# Altium schematic symbol library IC.SchLib: 555 symbols (part 9 of 15) (continued)
## PEX8648BB (continued)
part F pins: G7 VDD25 (power), G9 VDD10A (power), G10 VDD10A (power), G11 VDD10A (power), G12 VDD10A (power), G13 VDD10A (power), G14 VDD10A (power), G15 VDD10A (power), G16 VDD10A (power), G17 VDD10A (power), G18 VDD10A (power), G20 VDD25 (power), H8 VDD25 (power), H19 VDD25 (power), J7 VDD10A (power), J9 VDD25 (power), J11 VDD10A (power), J13 VDD10A (power), J14 VDD10A (power), J16 VDD10A (power), J18 VDD25 (power), J20 VDD10A (power), K7 VDD10A (power), K10 VDD25 (power), K12 VDD25A (power), K15 VDD25A (power), K17 VDD25 (power), K20 VDD10A (power), L7 VDD10A (power), L9 VDD10A (power), L11 VDD10 (power), L13 VDD10 (power), L15 VDD10 (power), L18 VDD10A (power), L20 VDD10A (power), M7 VDD10A (power), M9 VDD10A (power), M12 VDD10 (power), M14 VDD10 (power), M16 VDD10 (power), M18 VDD10A (power), M20 VDD10A (power), N7 VDD10A (power), N10 VDD25A (power), N11 VDD10 (power), N13 VDD10 (power), N15 VDD10 (power), N17 VDD25A (power), N20 VDD10A (power), P7 VDD10A (power), P9 VDD10A (power), P12 VDD10 (power), P14 VDD10 (power), P16 VDD10 (power), P18 VDD10A (power), P20 VDD10A (power), R7 VDD10A (power), R10 VDD10A (power), R11 VDD10 (power), R13 VDD10 (power), R15 VDD10 (power), R17 VDD10A (power), R20 VDD10A (power), T7 VDD10A (power), T9 VDD10A (power), T12 VDD10 (power), T14 VDD10 (power), T16 VDD10 (power), T18 VDD10A (power), T20 VDD10A (power), U7 VDD10A (power), U10 VDD25 (power), U12 VDD25A (power), U15 VDD25A (power), U17 VDD25 (power), U20 VDD10A (power), V8 VDD25 (power), V9 VDD25 (power), V11 VDD10A (power), V13 VDD10A (power), V14 VDD10A (power), V16 VDD10A (power), V18 VDD25 (power), V19 VDD25 (power), W7 VDD25 (power), W8 VDD25 (power), W19 VDD25 (power), W20 VDD25 (power), Y7 VDD25 (power), Y9 VDD10A (power), Y10 VDD10A (power), Y11 VDD10A (power), Y12 VDD10A (power), Y13 VDD10A (power), Y14 VDD10A (power), Y15 VDD10A (power), Y16 VDD10A (power), Y17 VDD10A (power), Y18 VDD10A (power), Y20 VDD25 (power)
part A text: STATION 0 LANES
part B text: STATION 1 LANES
part C text: STATION 2 LANES
part D text: PCIe INTERFACE; JTAG INTERFACE; I2C INTERFACE; MONITORS; HOT PLUG; EEPROM INTERFACE; CONFIGURATION STRAP PINS; PORT STATUS AND GPIO; MISC. AND SPARE

## PI2DBS212
designator U?
1.8V, 1.8GHz Diff 2:1 Mux/DeMux Broadband Signal Switch; Manufacturer No: PI2DBS212ZHE; Manufacturer: Pericom; Tech: SMDR; Sort: 510; Package: TQFN28
footprint TQFN28 (TQFN 28pin 0.8mm R0.5mm)
pins: 1 GND (power), 2 NC, 3 SEL (in), 4 A0+ (io), 5 A0- (io), 6 A1+ (io), 7 A1- (io), 8 NC, 9 VDD (power), 10 GND (power), 11 VDD (power), 12 GND (power), 13 VDD (power), 14 GND (power), 15 C1- (io), 16 C1+ (io), 17 C0- (io), 18 C0+ (io), 19 VDD (power), 20 GND (power), 21 B1- (io), 22 B1+ (io), 23 B0- (io), 24 B0+ (io), 25 GND (power), 26 VDD (power), 27 GND (power), 28 VDD (power), 29 GNDE (power)

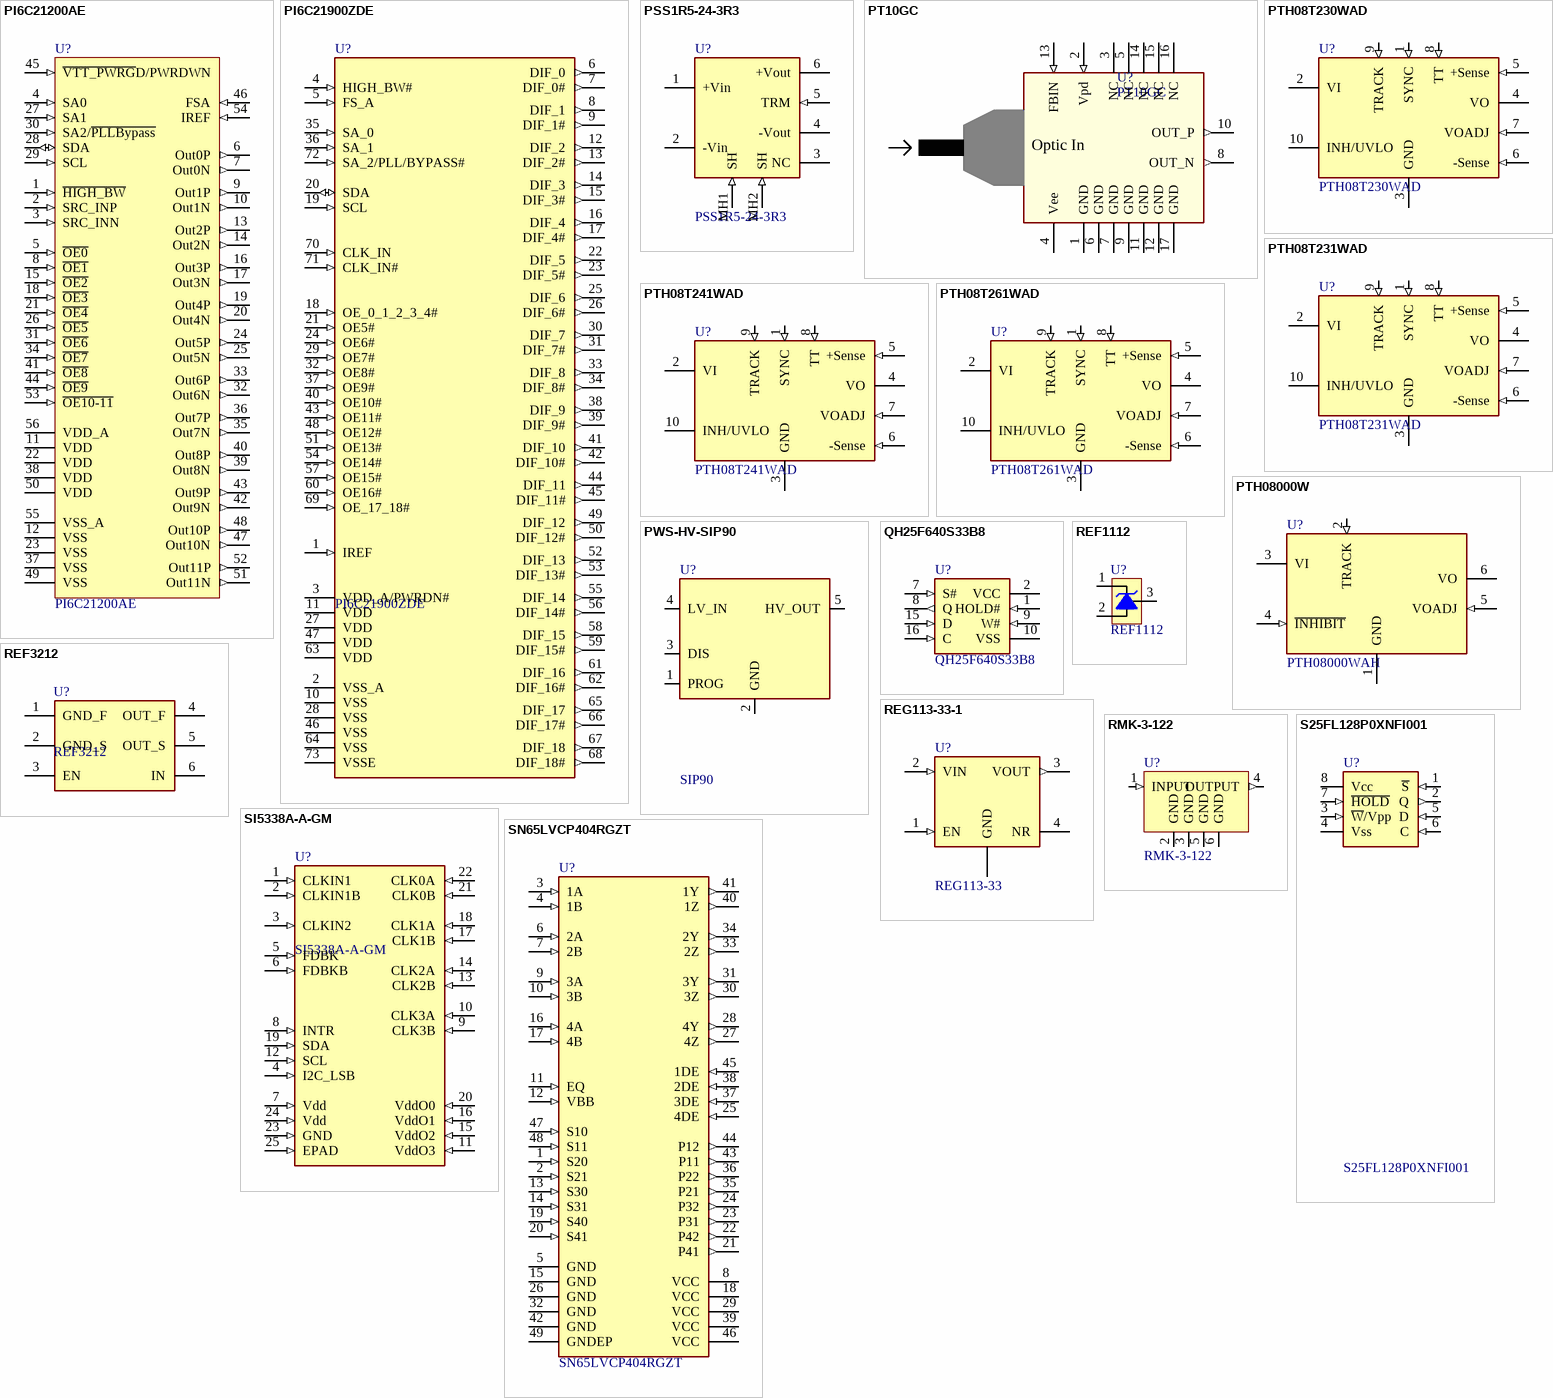
[diagram p38: symbols PI6C21200AE to SN65LVCP404RGZT]

## PI6C21200AE
designator U?
1:12 Clock Driver for Intel PCI-Express Chipsets; Manufacturer: Pericom; Tech: SMDR; Sort: 510; Manufacturer No: PI6C21200AE; Package: TSSOP56
footprint TSSOP56 (TSSOP 56pin R0.5mm)
pins: 1 ~{HIGH_BW} (in), 2 SRC_INP (in), 3 SRC_INN (in), 4 SA0 (in), 5 ~{OE0} (in), 6 Out0P (out), 7 Out0N (out), 8 ~{OE1} (in), 9 Out1P (out), 10 Out1N (out), 11 VDD (power), 12 VSS (power), 13 Out2P (out), 14 Out2N (out), 15 ~{OE2} (in), 16 Out3P (out), 17 Out3N (out), 18 ~{OE3} (in), 19 Out4P (out), 20 Out4N (out), 21 ~{OE4} (in), 22 VDD (power), 23 VSS (power), 24 Out5P (out), 25 Out5N (out), 26 ~{OE5} (in), 27 SA1 (in), 28 SDA (io), 29 SCL (in), 30 SA2/~{PLLBypass} (in), 31 ~{OE6} (in), 32 Out6N (out), 33 Out6P (out), 34 ~{OE7} (in), 35 Out7N (out), 36 Out7P (out), 37 VSS (power), 38 VDD (power), 39 Out8N (out), 40 Out8P (out), 41 ~{OE8} (in), 42 Out9N (out), 43 Out9P (out), 44 ~{OE9} (in), 45 ~{VTT_PWRG}D/PWRDWN (in), 46 FSA (in), 47 Out10N (out), 48 Out10P (out), 49 VSS (power), 50 VDD (power), 51 Out11N (out), 52 Out11P (out), 53 ~{OE10-11} (in), 54 IREF (in), 55 VSS_A (power), 56 VDD_A (power)

## PI6C21900ZDE
designator U?
PCI Express Gen II1: Geared Differential Buffer - 17 and 2 Outputs; Manufacturer: Pericom; Tech: SMDR; Sort: 510; Manufacturer No: PI6C21900ZDE; Package: TQFN-72
footprint TQFN72N
pins: 1 IREF (in), 2 VSS_A (power), 3 VDD_A/PWRDN# (power), 4 HIGH_BW# (in), 5 FS_A (in), 6 DIF_0 (out), 7 DIF_0# (out), 8 DIF_1 (out), 9 DIF_1# (out), 10 VSS (power), 11 VDD (power), 12 DIF_2 (out), 13 DIF_2# (out), 14 DIF_3 (out), 15 DIF_3# (out), 16 DIF_4 (out), 17 DIF_4# (out), 18 OE_0_1_2_3_4# (in), 19 SCL (in), 20 SDA (io), 21 OE5# (in), 22 DIF_5 (out), 23 DIF_5# (out), 24 OE6# (in), 25 DIF_6 (out), 26 DIF_6# (out), 27 VDD (power), 28 VSS (power), 29 OE7# (in), 30 DIF_7 (out), 31 DIF_7# (out), 32 OE8# (in), 33 DIF_8 (out), 34 DIF_8# (out), 35 SA_0 (in), 36 SA_1 (in), 37 OE9# (in), 38 DIF_9 (out), 39 DIF_9# (out), 40 OE10# (in), 41 DIF_10 (out), 42 DIF_10# (out), 43 OE11# (in), 44 DIF_11 (out), 45 DIF_11# (out), 46 VSS (power), 47 VDD (power), 48 OE12# (in), 49 DIF_12 (out), 50 DIF_12# (out), 51 OE13# (in), 52 DIF_13 (out), 53 DIF_13# (out), 54 OE14# (in), 55 DIF_14 (out), 56 DIF_14# (out), 57 OE15# (in), 58 DIF_15 (out), 59 DIF_15# (out), 60 OE16# (in), 61 DIF_16 (out), 62 DIF_16# (out), 63 VDD (power), 64 VSS (power), 65 DIF_17 (out), 66 DIF_17# (out), 67 DIF_18 (out), 68 DIF_18# (out), 69 OE_17_18# (in), 70 CLK_IN (in), 71 CLK_IN# (in), 72 SA_2/PLL/BYPASS# (in), 73 VSSE (power)

## PSS1R5-24-3R3
designator U?
Step down converter 1A SOIC8; Manufacturer: Densei-Lambda; Sort: 510; Tech: THDW; Manufacturer No: PSS1R5-24-3R3; Package: DCD/DC20x16; Price: 0
footprint PSS1R5 (DC-DC1.5W)
pins: 1 +Vin (power), 2 -Vin (power), 3 NC, 4 -Vout (power), 5 TRM (in), 6 +Vout (power), MH1 SH (in), MH2 SH (in)

## PT10GC
designator U?
10Gb/s Coplanar PIN Preamp Receiver; Manufacturer: Bookham; Sort: 510; Tech: SMDR; Manufacturer No: PT10GC; Price: 0
footprint PT10GC (10Gb/s PIN Preamp Receiver PT10GC)
pins: 1 GND (power), 2 Vpd (in), 3 NC (power), 4 Vee (power), 5 NC, 6 GND (power), 7 GND (power), 8 OUT_N (out), 9 GND (power), 10 OUT_P (out), 11 GND (power), 12 GND (power), 13 FBIN (in), 14 NC (power), 15 NC (power), 16 NC (power), 17 GND (power)
text: Optic In

## PTH08T230WAD
designator U?
6A, 4.5V to 14Vin, non-isolated, wide output, adjustable power module; Manufacturer: Texas Instruments; Comment2: 6A 4.5 -14Vin, 0.69-5.5Vout; Sort: 550; Tech: THDW; Manufacturer No: PTH08T230WAD; Package: POWMOD ECL; Price: 0
footprint PTH08TECL (Power Module 19x16x8.5mm  THT)
pins: 1 SYNC (in), 2 VI (power), 3 GND (power), 4 VO (power), 5 +Sense (in), 6 -Sense (in), 7 VOADJ (in), 8 TT (in), 9 TRACK (in), 10 INH/UVLO

## PTH08T231WAD
designator U?
6A, 4.5V to 14Vin, non-isolated, wide output, adjustable power module; cer cap.; Manufacturer: Texas Instruments; Comment2: 6A 4.5 -14Vin, 0.69-5.5Vout; Sort: 550; Tech: THDW; Manufacturer No: PTH08T231WAD; Package: POWMOD ECL; Price: 0
footprint PTH08TECL (Power Module 19x16x8.5mm  THT)
pins: 1 SYNC (in), 2 VI (power), 3 GND (power), 4 VO (power), 5 +Sense (in), 6 -Sense (in), 7 VOADJ (in), 8 TT (in), 9 TRACK (in), 10 INH/UVLO

## PTH08T241WAD
designator U?
10A, 4.5V to 14Vin, non-isolated, wide output, adjustable power module; cer cap.; Manufacturer: Texas Instruments; Comment2: 10A 4.5 -14Vin, 0.69-5.5Vout; Sort: 550; Tech: THDW; Manufacturer No: PTH08T241WAD; Package: POWMOD EBS; Price: 0
footprint PTH08TECL (Power Module 19x16x8.5mm  THT)
pins: 1 SYNC (in), 2 VI (power), 3 GND (power), 4 VO (power), 5 +Sense (in), 6 -Sense (in), 7 VOADJ (in), 8 TT (in), 9 TRACK (in), 10 INH/UVLO

## PTH08T261WAD
designator U?
3A, 4.5V to 14Vin, non-isolated, wide output, adjustable power module; cer cap.; Manufacturer: Texas Instruments; Comment2: 3A 4.5 -14Vin, 0.69-5.5Vout; Sort: 550; Tech: THDW; Manufacturer No: PTH08T261WAD; Package: POWMOD ECL; Price: 0
footprint PTH08TECL (Power Module 19x16x8.5mm  THT)
pins: 1 SYNC (in), 2 VI (power), 3 GND (power), 4 VO (power), 5 +Sense (in), 6 -Sense (in), 7 VOADJ (in), 8 TT (in), 9 TRACK (in), 10 INH/UVLO

## PTH08000W
designator U?, comment PTH08000WAH
2.25A, 4.5V to 14Vin, non-isolated, wide output, adjustable power module; Manufacturer: Texas Instruments; Comment2: 2.25A 4.5 -14Vin, 0.9-5.5Vout; Sort: 550; Tech: THDW; Manufacturer No: PTH08000WAH; Package: POWMOD EUS; Price: 0
footprint PTH08TEUS (Power Module EUS 19x13x8.5mm  THT)
pins: 1 GND (power), 2 TRACK (in), 3 VI (power), 4 ~{INHIBIT} (in), 5 VOADJ (in), 6 VO (power)

## PWS-HV-SIP90
designator U?, comment SIP90
Regulated, Low Ripple High Voltage DC/DC Converter; Manufacturer: Emco; Comment2: 3-6.7V Vin, 25-90 VDC, 1mA max; Sort: 510; Tech: TMDW; Manufacturer No: SIP90; Package: SIP90; Price: 0; Supplier: EMCO; Supplier No: SIP90
footprint SIP90 (SIP90 Emco HV Power supply)
pins: 1 PROG, 2 GND, 3 DIS, 4 LV_IN, 5 HV_OUT

## QH25F640S33B8
designator U?
EEPROM 64Mbit SPI 2.5-3.3V 33.3/68MHz read; Manufacturer: Intel; Sort: 510; Tech: SMDR; Manufacturer No: QH25F640S33B8; Package: SOIC16W; Price: 0
signal-integrity model Model Name (Model Description)
footprint SOIC16WN (SOIC, 16-Leads, Body 10,4x7,5mm (max), Pitch 1,27mm, IPC Medium Density)
pins: 1 HOLD# (in), 2 VCC (power), 7 S# (in), 8 Q (out), 9 W# (in), 10 VSS (power), 15 D (in), 16 C (in)

## REF1112
designator U?
Voltage reference; low noise 1.25V; Manufacturer: Texas Instruments; Comment2: 10ppm/C, 1uA, 1.25V, 5mA MAX; Sort: 510; Tech: SMDR; Package: SOT23; Manufacturer No: REF1112; Price: 0
footprint SOT23-1
pins: 1 C, 2 A, 3 REF

## REF3212
designator U?
Series Voltage Reference; Manufacturer: Texas Instruments; Manufacturer No: REF3212AIDBVT; Comment2: 1.25V, 4ppm/C, 100uA, 10mA MAX; Sort: 510; Tech: SMDR; Package: SOT23; Price: 0
footprint SOT23-6
pins: 1 GND_F, 2 GND_S, 3 EN, 4 OUT_F, 5 OUT_S, 6 IN

## REG113-33-1
designator U?, comment REG113-33
DMOS 400mA Low Drop Regulator; Manufacturer: Linear Technologies; Manufacturer No: REG113NA-3.3/250; Sort: 510; Tech: SMDR; Package: MSOP; Price: 0
footprint SOT23-5
pins: 1 EN (in), 2 VIN (in), 3 VOUT (out), 4 NR, GND (power)

## RMK-3-122
designator U?
Mixer; Manufacturer: MiniCircuits; Sort: 510; Tech: SMDR; Package: SOT89; Price: 0
footprint RMK-3
pins: 1 INPUT (in), 2 GND (power), 3 GND (power), 4 OUTPUT (out), 5 GND (power), 6 GND (power)

## S25FL128P0XNFI001
designator U?
128 Mbit serial flash memory with 104MHz SPI bus; Manufacturer: Spansion, Farnell; Manufacturer No: S25FL128P0XNFI001, 1791301; Comment2: 128Mbit, SPI, 104MHz 2,7~3,6Vcc; Sort: 510; Tech: SMDR; Package: WSON8 6x8mm; Price: 9.8
footprint Model Name (Footprint not found)
footprint DFN127P800X600X75EP640-8N (WSON, DFN, 8-Leads, 6,0x8,0mm, P1,27mm, IPC Medium Density)
pins: 1 ~{S} (in), 2 Q (out), 3 ~{W}/Vpp (in), 4 Vss (power), 5 D (in), 6 C (in), 7 ~{HOLD} (in), 8 Vcc (power)

## SI5338A-A-GM
designator U?
I2C-PROGRAMMABLE ANY-FREQUENCY, ANY-OUTPUT  QUAD CLOCK GENERATOR; Manufacturer: Silicon Labs, Digi-Key; Manufacturer No: SI5338A-A-GM, 336-1553-5-ND; Sort: 510; Tech: SMDR; Price: 0
footprint QFN24-1 (QFN24; 24 Leads; Body Width 4.0 mm; Pitch 0.5 mm)
pins: 1 CLKIN1 (in), 2 CLKIN1B (in), 3 CLKIN2 (in), 4 I2C_LSB (in), 5 FDBK (in), 6 FDBKB (in), 7 Vdd (in), 8 INTR (in), 9 CLK3B (in), 10 CLK3A (in), 11 VddO3 (in), 12 SCL (in), 13 CLK2B (in), 14 CLK2A (in), 15 VddO2 (in), 16 VddO1 (in), 17 CLK1B (in), 18 CLK1A (in), 19 SDA (in), 20 VddO0 (in), 21 CLK0B (in), 22 CLK0A (in), 23 GND (in), 24 Vdd (in), 25 EPAD (in)

## SN65LVCP404RGZT
designator U?
Gigabit 4x4 CROSSPOINT SWITCH; Manufacturer: Texas; Sort: 510; Tech: SMDR; Manufacturer No: SN65LVCP404RGZT; Package: QFN-48; Price: 0
pins: 1 S20 (in), 2 S21 (in), 3 1A (in), 4 1B (in), 5 GND (power), 6 2A (in), 7 2B (in), 8 VCC (power), 9 3A (in), 10 3B (in), 11 EQ (in), 12 VBB (in), 13 S30 (in), 14 S31 (in), 15 GND (power), 16 4A (in), 17 4B (in), 18 VCC (power), 19 S40 (in), 20 S41 (in), 21 P41 (out), 22 P42 (out), 23 P31 (out), 24 P32 (out), 25 4DE (in), 26 GND (power), 27 4Z (out), 28 4Y (out), 29 VCC (power), 30 3Z (out), 31 3Y (out), 32 GND (power), 33 2Z (out), 34 2Y (out), 35 P21 (out), 36 P22 (out), 37 3DE (in), 38 2DE (in), 39 VCC (power), 40 1Z (out), 41 1Y (out), 42 GND (power), 43 P11 (out), 44 P12 (out), 45 1DE (in), 46 VCC (power), 47 S10 (in), 48 S11 (in), 49 GNDEP (power)

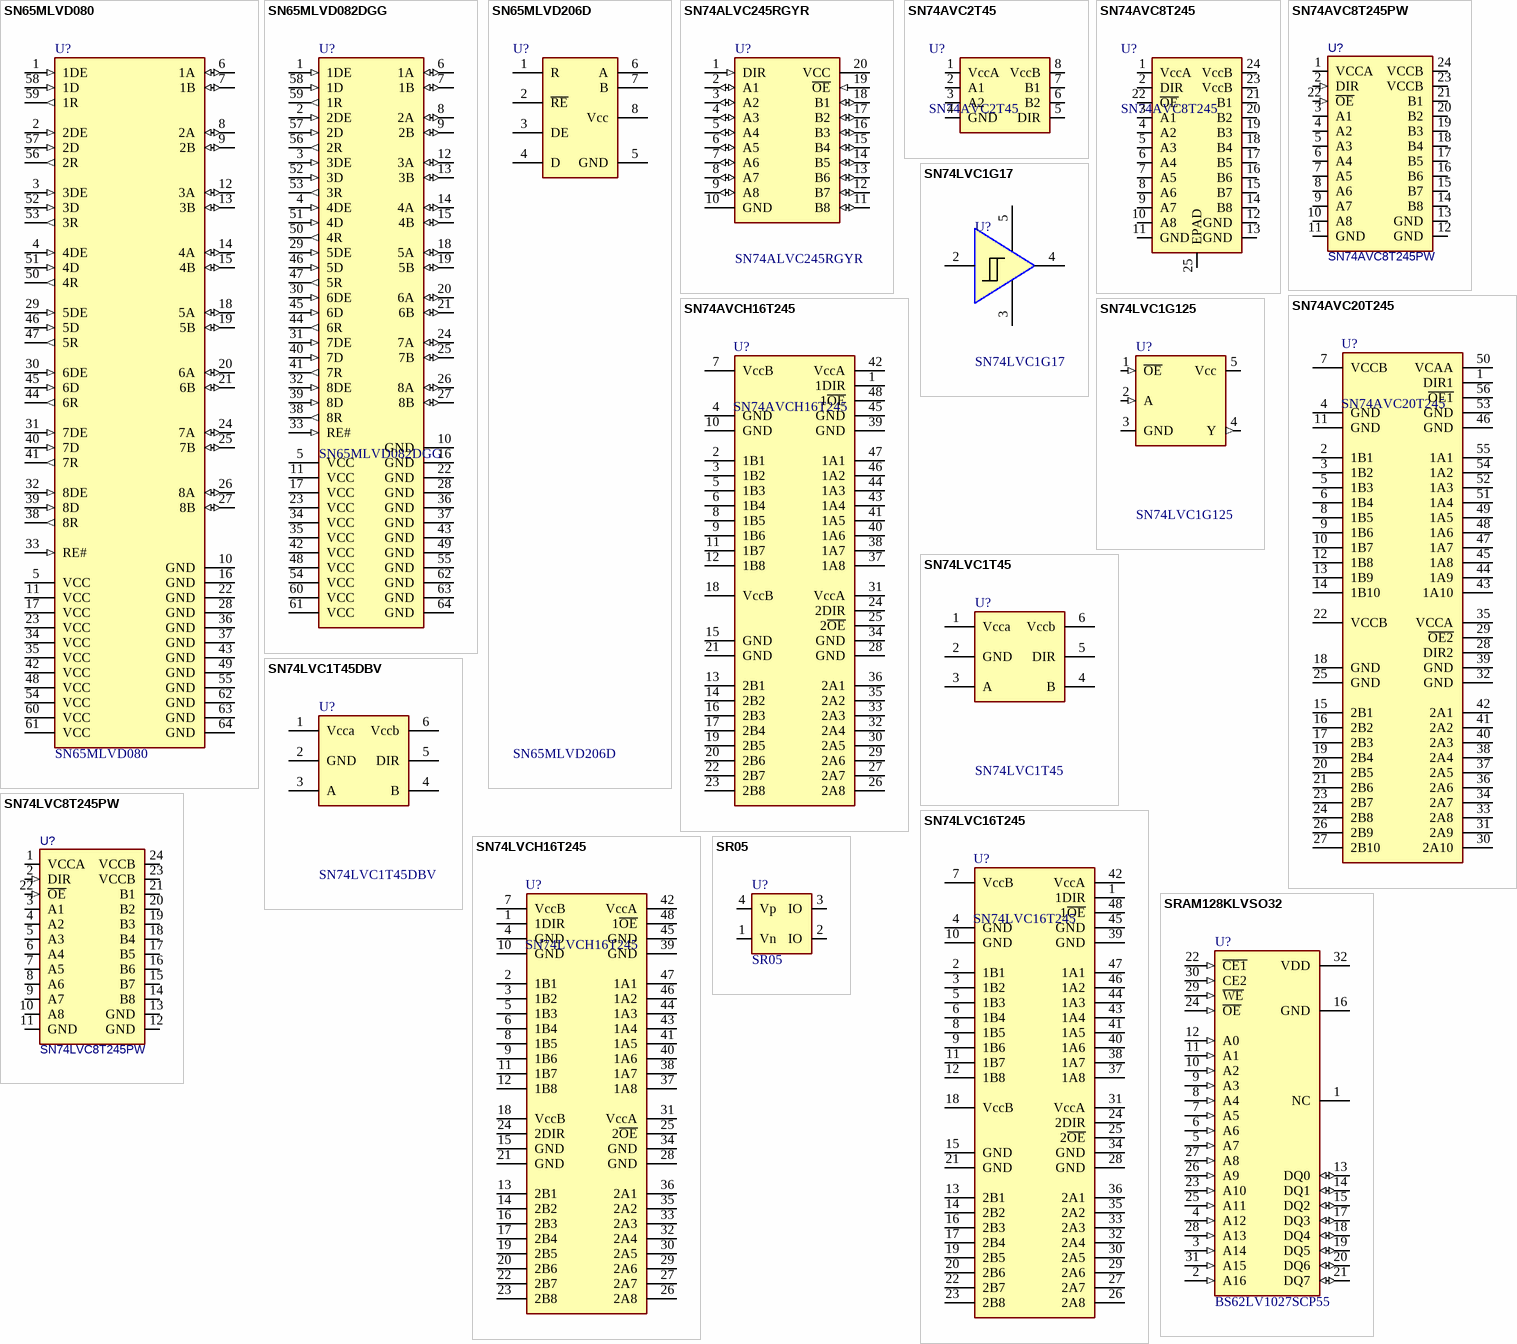
[diagram p39: symbols SN65MLVD080 to SRAM128KLVSO32]

## SN65MLVD080
designator U?
8ch half-duplex M-LVDS line transceiver; Manufacturer: Texas; Manufacturer No: SN65MLVD080DGG; Sort: 510; Tech: SMDR; Package: TSSOP (DGG) 64pin; Price: 0
footprint TSSOP64N (TSSOP, 64-Leads, Body 17,1x6,2mm (max), Pitch 0,50mm, IPC Medium Density)
pins: 1 1DE (in), 2 2DE (in), 3 3DE (in), 4 4DE (in), 5 VCC (power), 6 1A (io), 7 1B (io), 8 2A (io), 9 2B (io), 10 GND (power), 11 VCC (power), 12 3A (io), 13 3B (io), 14 4A (io), 15 4B (io), 16 GND (power), 17 VCC (power), 18 5A (io), 19 5B (io), 20 6A (io), 21 6B (io), 22 GND (power), 23 VCC (power), 24 7A (io), 25 7B (io), 26 8A (io), 27 8B (io), 28 GND (power), 29 5DE (in), 30 6DE (in), 31 7DE (in), 32 8DE (in), 33 RE# (in), 34 VCC (power), 35 VCC (power), 36 GND (power), 37 GND (power), 38 8R (out), 39 8D (in), 40 7D (in), 41 7R (out), 42 VCC (power), 43 GND (power), 44 6R (out), 45 6D (in), 46 5D (in), 47 5R (out), 48 VCC (power), 49 GND (power), 50 4R (out), 51 4D (in), 52 3D (in), 53 3R (out), 54 VCC (power), 55 GND (power), 56 2R (out), 57 2D (in), 58 1D (in), 59 1R (out), 60 VCC (power), 61 VCC (power), 62 GND (power), 63 GND (power), 64 GND (power)

## SN65MLVD082DGG
designator U?
8ch Half duplex M-LVDS line transceivers; Manufacturer: Texas Instruments; Comment2: 3-3.6Vcc; Sort: 510; Tech: SMDR; Manufacturer No: SN65MLVD082DGG; Package: TSSOP64; Price: 12.3
footprint Model Name (Footprint not found)
footprint TSSOP64N (TSSOP, 64-Leads, Body 17,1x6,2mm (max), Pitch 0,50mm, IPC Medium Density)
pins: 1 1DE (in), 2 2DE (in), 3 3DE (in), 4 4DE (in), 5 VCC (power), 6 1A (io), 7 1B (io), 8 2A (io), 9 2B (io), 10 GND (power), 11 VCC (power), 12 3A (io), 13 3B (io), 14 4A (io), 15 4B (io), 16 GND (power), 17 VCC (power), 18 5A (io), 19 5B (io), 20 6A (io), 21 6B (io), 22 GND (power), 23 VCC (power), 24 7A (io), 25 7B (io), 26 8A (io), 27 8B (io), 28 GND (power), 29 5DE (in), 30 6DE (in), 31 7DE (in), 32 8DE (in), 33 RE# (in), 34 VCC (power), 35 VCC (power), 36 GND (power), 37 GND (power), 38 8R (out), 39 8D (in), 40 7D (in), 41 7R (out), 42 VCC (power), 43 GND (power), 44 6R (out), 45 6D (in), 46 5D (in), 47 5R (out), 48 VCC (power), 49 GND (power), 50 4R (out), 51 4D (in), 52 3D (in), 53 3R (out), 54 VCC (power), 55 GND (power), 56 2R (out), 57 2D (in), 58 1D (in), 59 1R (out), 60 VCC (power), 61 VCC (power), 62 GND (power), 63 GND (power), 64 GND (power)

## SN65MLVD206D
designator U?
MULTIPOINT-LVDS LINE DRIVER AND RECEIVER; Manufacturer: Texas Instruments, Mouser, Digi-Key; Manufacturer No: SN65MLVD206D, 595-SN65MLVD206D, 296-14189-5-ND; Alt. Manufacturer: National Semi, Digi-Key; Alt. Manufacturer No: DS91C176TMA/NOPB, DS91C176TMA-ND; Comment2: +3.3Vcc; Sort: 510; Tech: SMDR; Package: QFN16; Price: 0
footprint SOIC8-1
signal-integrity model Model Name (Model Description)
pins: 1 R, 2 ~{RE}, 3 DE, 4 D, 5 GND, 6 A, 7 B, 8 Vcc

## SN74ALVC245RGYR
designator U?
8-BIT DUAL-SUPPLY BUS TRANSCEIVER; Manufacturer: Texas Instruments; Sort: 510; Tech: SMDR; Manufacturer No: SN74ALVC245RGYR; Price: 0
footprint QFN50P350X450X100-20N (QFN, 20-Leads, Body 4,7x3,7mm (max), Pitch 0,50mm, IPC Medium Density)
signal-integrity model Model Name (Model Description)
pins: 1 DIR (in), 2 A1 (io), 3 A2 (io), 4 A3 (io), 5 A4 (io), 6 A5 (io), 7 A6 (io), 8 A7 (io), 9 A8 (io), 10 GND (power), 11 B8 (io), 12 B7 (io), 13 B6 (io), 14 B5 (io), 15 B4 (io), 16 B3 (io), 17 B2 (io), 18 B1 (io), 19 ~{OE} (in), 20 VCC (power)

## SN74AVC2T45
designator U?
16-Bit Dual-Supply Bus Transceiver with Configurable Voltage Translation And 3-State Outputs; Manufacturer: Texas Instruments, Digi-Key; Manufacturer No: SN74AVC2T45DCUR, 296-17993-1-ND; Comment2: 3.3V 500MHz; Sort: 510; Tech: SMDR; Package: TSSOP; Price: 0
footprint TSSOP8-1 (TSSOP8 3x3mm R0.5mm)
pins: 1 VccA, 2 A1, 3 A2, 4 GND, 5 DIR, 6 B2, 7 B1, 8 VccB

## SN74AVC8T245
designator U?
16-Bit Dual-Supply Bus Transceiver with Configurable Voltage Translation And 3-State Outputs; Manufacturer: Texas Instruments, Digi-Key; Manufacturer No: SN74AVC8T245RHLR, 296-17859-1-ND; Comment2: 3.3V 320MHz; Sort: 510; Tech: SMDR; Package: TSSOP; Price: 0
footprint QFN50P350X550X100-24N (QFN, 20-Leads, Body 5,5x3,5mm (max), Pitch 0,50mm, IPC Medium Density)
footprint QFN50P350X550X100-24N-B (QFN, 20-Leads, Body 5,5x3,5mm (max), Pitch 0,50mm, IPC Medium Density)
pins: 1 VccA, 2 DIR, 3 A1, 4 A2, 5 A3, 6 A4, 7 A5, 8 A6, 9 A7, 10 A8, 11 GND, 12 GND, 13 GND, 14 B8, 15 B7, 16 B6, 17 B5, 18 B4, 19 B3, 20 B2, 21 B1, 22 ~{OE}, 23 VccB, 24 VccB, 25 EPAD

## SN74AVC8T245PW
designator U?
8-BIT DUAL-SUPPLY BUS TRANSCEIVER; Manufacturer: Texas Instruments, Farnell, Digi-Key; Manufacturer No: SN74AVC8T245PW, 1053490, 296-19100-1-ND; Sort: 510; Tech: SMDR; Package: TSSOP24; Price: 0
footprint TSSOP24-TI (Plastic Small Outline 24pin R0.65mm 7.8x4.4x1.2mm)
signal-integrity model Model Name (Model Description)
pins: 1 VCCA (power), 2 DIR (in), 3 A1 (io), 4 A2 (io), 5 A3 (io), 6 A4 (io), 7 A5 (io), 8 A6 (io), 9 A7 (io), 10 A8 (io), 11 GND (power), 12 GND (power), 13 GND (power), 14 B8 (io), 15 B7 (io), 16 B6 (io), 17 B5 (io), 18 B4 (io), 19 B3 (io), 20 B2 (io), 21 B1 (io), 22 ~{OE} (in), 23 VCCB (power), 24 VCCB (power)

## SN74AVC20T245
designator U?
20-Bit Dual-Supply Bus Transceiver with Configurable Voltage Translation And 3-State Outputs; Manufacturer: Texas Instruments, Digi-Key; Manufacturer No: SN74AVC20T245DGVR, 296-19095-1-ND; Comment2: 1.2/3.6V 380MHz; Sort: 510; Tech: SMDR; Package: TSSOP; Price: 0
footprint TSSOP56 (TSSOP 56pin R0.5mm)
pins: 1 DIR1, 2 1B1, 3 1B2, 4 GND, 5 1B3, 6 1B4, 7 VCCB, 8 1B5, 9 1B6, 10 1B7, 11 GND, 12 1B8, 13 1B9, 14 1B10, 15 2B1, 16 2B2, 17 2B3, 18 GND, 19 2B4, 20 2B5, 21 2B6, 22 VCCB, 23 2B7, 24 2B8, 25 GND, 26 2B9, 27 2B10, 28 DIR2, 29 ~{OE2}, 30 2A10, 31 2A9, 32 GND, 33 2A8, 34 2A7, 35 VCCA, 36 2A6, 37 2A5, 38 2A4, 39 GND, 40 2A3, 41 2A2, 42 2A1, 43 1A10, 44 1A9, 45 1A8, 46 GND, 47 1A7, 48 1A6, 49 1A5, 50 VCAA, 51 1A4, 52 1A3, 53 GND, 54 1A2, 55 1A1, 56 ~{OE1}

## SN74AVCH16T245
designator U?
16-Bit Dual-Supply Bus Transceiver with Configurable Voltage Translation And 3-State Outputs; Manufacturer: Texas Instruments, Digi-Key; Manufacturer No: SN74AVCH16T245GR, 296-18283-1-ND; Comment2: 3.3V 270MHz; Sort: 510; Tech: SMDR; Package: TSSOP; Price: 0
footprint TSSOP48 (TSSOP, 48-Leads, Body 12,6x6,2mm (max), Pitch 0,50mm, IPC Medium Density)
pins: 1 1DIR, 2 1B1, 3 1B2, 4 GND, 5 1B3, 6 1B4, 7 VccB, 8 1B5, 9 1B6, 10 GND, 11 1B7, 12 1B8, 13 2B1, 14 2B2, 15 GND, 16 2B3, 17 2B4, 18 VccB, 19 2B5, 20 2B6, 21 GND, 22 2B7, 23 2B8, 24 2DIR, 25 2~{OE}, 26 2A8, 27 2A7, 28 GND, 29 2A6, 30 2A5, 31 VccA, 32 2A4, 33 2A3, 34 GND, 35 2A2, 36 2A1, 37 1A8, 38 1A7, 39 GND, 40 1A6, 41 1A5, 42 VccA, 43 1A4, 44 1A3, 45 GND, 46 1A2, 47 1A1, 48 1~{OE}

## SN74LVC1G17
designator U?
Single Schmitt-Trigger Buffer; Manufacturer: Texas Instruments; Manufacturer No: SN74LVC1G17DBV3; Sort: 510; Tech: SMDR; Package: SOT23; Price: 0
footprint SOT23-5
pins: 2 A, 3 GND (power), 4 Y, 5 VCC (power)

## SN74LVC1G125
designator U?
SINGLE BUS BUFFER GATE  WITH 3-STATE OUTPUT; Manufacturer: Texas Instruments, Farnell; Manufacturer No: SN74LVC1G125DBVR, 1470768; Comment2: -0.5V to 6.5V; Sort: 510; Tech: SMDR; Package: SOT23; Price: 0
footprint SOT23-5
pins: 1 ~{OE} (in), 2 A (in), 3 GND (power), 4 Y (out), 5 Vcc (power)

## SN74LVC1T45
designator U?
Single bit Dual-supply bus transceiver with configurable voltage translation and 3-state outputs; Manufacturer: Texas Instruments; Manufacturer No: SN74LVC1T45DBVT; Comment2: 1.65V to 5.5V; Sort: 510; Tech: SMDR; Package: SOT23; Price: 0
footprint SOT23-6
pins: 1 Vcca (power), 2 GND (power), 3 A, 4 B, 5 DIR, 6 Vccb (power)

## SN74LVC1T45DBV
designator U?
Single bit Dual-supply bus transceiver with configurable voltage translation and 3-state outputs; Manufacturer: Texas Instruments, Farnell; Manufacturer No: SN74LVC1T45DBVT, 1470916; Comment2: 1.65..5.5VccA&B +-24mAout (CT1_); Sort: 510; Tech: SMDR; Package: SOT23-6; Price: 0
footprint SOT23-6
pins: 1 Vcca (power), 2 GND (power), 3 A, 4 B, 5 DIR, 6 Vccb (power)
1 alternate drawing of the same symbol

## SN74LVC8T245PW
designator U?
8-BIT DUAL-SUPPLY BUS TRANSCEIVER; Manufacturer: Texas Instruments, Digi-Key; Manufacturer No: SN74LVC8T245PW, 296-18593-1-ND; Sort: 510; Tech: SMDR; Package: TSSOP24; Price: 0
footprint TSSOP24-TI (Plastic Small Outline 24pin R0.65mm 7.8x4.4x1.2mm)
signal-integrity model Model Name (Model Description)
pins: 1 VCCA (power), 2 DIR (in), 3 A1 (io), 4 A2 (io), 5 A3 (io), 6 A4 (io), 7 A5 (io), 8 A6 (io), 9 A7 (io), 10 A8 (io), 11 GND (power), 12 GND (power), 13 GND (power), 14 B8 (io), 15 B7 (io), 16 B6 (io), 17 B5 (io), 18 B4 (io), 19 B3 (io), 20 B2 (io), 21 B1 (io), 22 ~{OE} (in), 23 VCCB (power), 24 VCCB (power)

## SN74LVC16T245
designator U?
16-Bit Dual-Supply Bus Transceiver with Configurable Voltage Translation And 3-State Outputs; Manufacturer: Texas Instruments, Farnell; Manufacturer No: SN74LVC16T245DGGR, 1494928RL; Comment2: 3.3/5.0V 160MHz; Sort: 510; Tech: SMDR; Package: TSSOP; Price: 0
footprint TSSOP48 (TSSOP, 48-Leads, Body 12,6x6,2mm (max), Pitch 0,50mm, IPC Medium Density)
pins: 1 1DIR, 2 1B1, 3 1B2, 4 GND, 5 1B3, 6 1B4, 7 VccB, 8 1B5, 9 1B6, 10 GND, 11 1B7, 12 1B8, 13 2B1, 14 2B2, 15 GND, 16 2B3, 17 2B4, 18 VccB, 19 2B5, 20 2B6, 21 GND, 22 2B7, 23 2B8, 24 2DIR, 25 2~{OE}, 26 2A8, 27 2A7, 28 GND, 29 2A6, 30 2A5, 31 VccA, 32 2A4, 33 2A3, 34 GND, 35 2A2, 36 2A1, 37 1A8, 38 1A7, 39 GND, 40 1A6, 41 1A5, 42 VccA, 43 1A4, 44 1A3, 45 GND, 46 1A2, 47 1A1, 48 1~{OE}

## SN74LVCH16T245
designator U?
16-Bit Dual-Supply Bus Transceiver with Configurable Voltage Translation And 3-State Outputs; Manufacturer: Texas Instruments; Manufacturer No: 74LVCH16T245DGGRG4; Comment2: 3.3/5.0V 160MHz; Sort: 510; Tech: SMDR; Package: TSSOP; Price: 0
footprint TSSOP48 (TSSOP, 48-Leads, Body 12,6x6,2mm (max), Pitch 0,50mm, IPC Medium Density)
pins: 1 1DIR, 2 1B1, 3 1B2, 4 GND, 5 1B3, 6 1B4, 7 VccB, 8 1B5, 9 1B6, 10 GND, 11 1B7, 12 1B8, 13 2B1, 14 2B2, 15 GND, 16 2B3, 17 2B4, 18 VccB, 19 2B5, 20 2B6, 21 GND, 22 2B7, 23 2B8, 24 2DIR, 25 2~{OE}, 26 2A8, 27 2A7, 28 GND, 29 2A6, 30 2A5, 31 VccA, 32 2A4, 33 2A3, 34 GND, 35 2A2, 36 2A1, 37 1A8, 38 1A7, 39 GND, 40 1A6, 41 1A5, 42 VccA, 43 1A4, 44 1A3, 45 GND, 46 1A2, 47 1A1, 48 1~{OE}

## SR05
designator U?
Low Capacitance TSOP-6 Diode-Low Capacitance TVS Diode Array; Manufacturer: Semtech; Manufacturer No: SR05.TCT; Sort: 510; Tech: SMDR; Package: SOT143; Price: 0
footprint SOT143 (SOT143, 4-Leads, Body 3,0x1.3mm, Pitch 1,92mm, IPC Medium Density)
pins: 1 Vn (power), 2 IO (io), 3 IO (io), 4 Vp (power)

## SRAM128KLVSO32
designator U?, comment BS62LV1027SCP55
Static RAM 128Kx8 low voltage SOIC32; Manufacturer: BSI; Sort: 510; Tech: SMDR; Manufacturer No: BS62LV1027SCP55; Package: SOIC32; Price: 0
footprint SOIC32 (SOIC, 32-Leads, Body 20.8x8.9mm, Pitch 1.27mm, IPC Medium Density)
pins: 1 NC, 2 A16 (in), 3 A14 (in), 4 A12 (in), 5 A7 (in), 6 A6 (in), 7 A5 (in), 8 A4 (in), 9 A3 (in), 10 A2 (in), 11 A1 (in), 12 A0 (in), 13 DQ0 (io), 14 DQ1 (io), 15 DQ2 (io), 16 GND (power), 17 DQ3 (io), 18 DQ4 (io), 19 DQ5 (io), 20 DQ6 (io), 21 DQ7 (io), 22 ~{CE1} (in), 23 A10 (in), 24 ~{OE} (in), 25 A11 (in), 26 A9 (in), 27 A8 (in), 28 A13 (in), 29 ~{WE} (in), 30 CE2 (in), 31 A15 (in), 32 VDD (power)

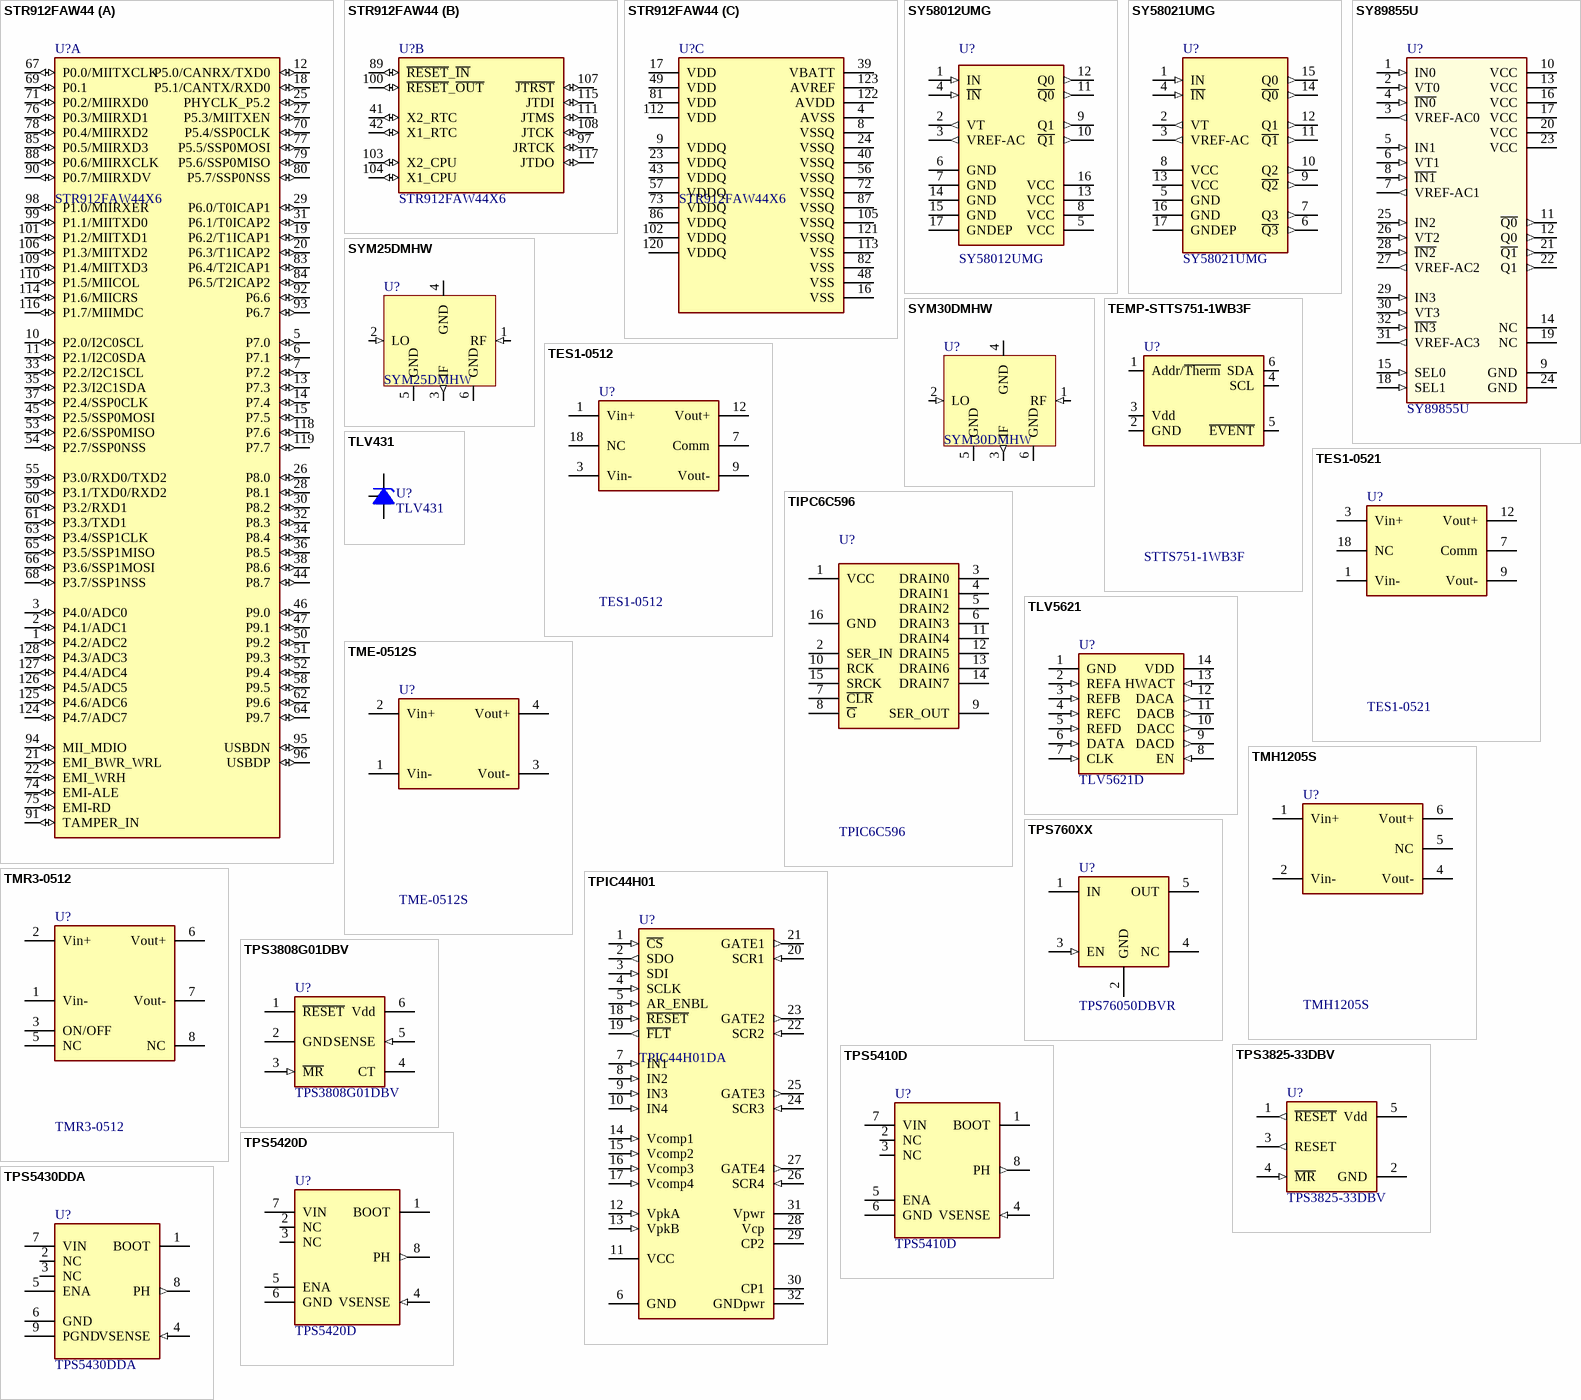
[diagram p40: symbols STR912FAW44 to TPS5430DDA]